# Altium schematic symbol library FPGA_Xilinx_Virtex7.SchLib: 34 symbols (part 13 of 26) (continued)
## XC7VX485T-FFG1927 (continued)
part M pins: A35 MGTREFCLK0P_219, A36 MGTREFCLK0N_219, A39 MGTXRXP3_219, A40 MGTXRXN3_219, B37 MGTXRXP2_219, B38 MGTXRXN2_219, B41 MGTXTXP3_219, B42 MGTXTXN3_219, C35 MGTREFCLK1P_219, C36 MGTREFCLK1N_219, C39 MGTXRXP1_219, C40 MGTXRXN1_219, C43 MGTXTXP2_219, C44 MGTXTXN2_219, D37 MGTXRXP3_218, D38 MGTXRXN3_218, D41 MGTXRXP0_219, D42 MGTXRXN0_219, E35 MGTREFCLK0P_218, E36 MGTREFCLK0N_218, E39 MGTXRXP2_218, E40 MGTXRXN2_218, E43 MGTXTXP1_219, E44 MGTXTXN1_219, F37 MGTXRXP1_218, F38 MGTXRXN1_218, F41 MGTXTXP0_219, F42 MGTXTXN0_219, G35 MGTREFCLK1P_218, G36 MGTREFCLK1N_218, G39 MGTXRXP0_218, G40 MGTXRXN0_218, G43 MGTXTXP3_218, G44 MGTXTXN3_218, H41 MGTXTXP2_218, H42 MGTXTXN2_218, J43 MGTXTXP1_218, J44 MGTXTXN1_218, K41 MGTXTXP0_218, K42 MGTXTXN0_218
part N pins: AA8 MGTAVCC_G10, AA37 MGTAVCC_G20, AB5 MGTAVTT_G10, AB40 MGTAVTT_G20, AC3 MGTAVTT_G10, AC7 MGTAVCC_G10, AC9 MGTRREF_115, AC10 MGTAVTTRCAL_115, AC35 MGTRREF_215, AC36 MGTAVTTRCAL_215, AC38 MGTAVCC_G20, AC42 MGTAVTT_G20, AD5 MGTAVTT_G10, AD40 MGTAVTT_G20, AE8 MGTAVCC_G10, AE37 MGTAVCC_G20, AF5 MGTAVTT_G10, AF40 MGTAVTT_G20, AG3 MGTAVTT_G10, AG8 MGTAVCC_G10, AG37 MGTAVCC_G20, AG42 MGTAVTT_G20, AH5 MGTAVTT_G10, AH40 MGTAVTT_G20, AJ3 MGTAVTT_G10, AJ7 MGTAVCC_G10, AJ38 MGTAVCC_G20, AJ42 MGTAVTT_G20, AL3 MGTAVTT_G9, AL8 MGTAVCC_G9, AL37 MGTAVCC_G19, AL42 MGTAVTT_G19, AM5 MGTAVTT_G9, AM10 MGTVCCAUX_G9, AM35 MGTVCCAUX_G19, AM40 MGTAVTT_G19, AN8 MGTAVCC_G9, AN37 MGTAVCC_G19, AP5 MGTAVTT_G9, AP10 MGTAVCC_G9, AP35 MGTAVCC_G19, AP40 MGTAVTT_G19, AR3 MGTAVTT_G9, AR8 MGTAVCC_G9, AR37 MGTAVCC_G19, AR42 MGTAVTT_G19, AT5 MGTAVTT_G9, AT40 MGTAVTT_G19, AU8 MGTAVCC_G9, AU37 MGTAVCC_G19, AV5 MGTAVTT_G9, AV40 MGTAVTT_G19, AW3 MGTAVTT_G9, AW8 MGTAVCC_G9, AW37 MGTAVCC_G19, AW42 MGTAVTT_G19, AY5 MGTAVTT_G9, AY40 MGTAVTT_G19, B5 MGTAVTT_G11, B10 MGTAVCC_G11, B35 MGTAVCC_G21, B40 MGTAVTT_G21, BA8 MGTAVCC_G9, BA37 MGTAVCC_G19, BB5 MGTAVTT_G9, BB40 MGTAVTT_G19, BC3 MGTAVTT_G9, BC8 MGTAVCC_G9, BC37 MGTAVCC_G19, BC42 MGTAVTT_G19, C3 MGTAVTT_G11, C42 MGTAVTT_G21, D5 MGTAVTT_G11, D10 MGTAVCC_G11, D35 MGTAVCC_G21, D40 MGTAVTT_G21, F5 MGTAVTT_G11, F10 MGTAVCC_G11, F35 MGTAVCC_G21, F40 MGTAVTT_G21, G3 MGTAVTT_G11, G42 MGTAVTT_G21, H5 MGTAVTT_G11, H10 MGTAVCC_G11, H35 MGTAVCC_G21, H40 MGTAVTT_G21, K5 MGTAVTT_G11, K10 MGTAVCC_G11, K35 MGTAVCC_G21, K40 MGTAVTT_G21, L3 MGTAVTT_G11, L42 MGTAVTT_G21, M5 MGTAVTT_G11, M10 MGTAVCC_G11, M35 MGTAVCC_G21, M40 MGTAVTT_G21, P5 MGTAVTT_G11, P10 MGTVCCAUX_G11, P35 MGTVCCAUX_G21, P40 MGTAVTT_G21, R3 MGTAVTT_G10, R8 MGTAVCC_G10, R37 MGTAVCC_G20, R42 MGTAVTT_G20, T5 MGTAVTT_G10, T10 MGTVCCAUX_G10, T35 MGTVCCAUX_G20, T40 MGTAVTT_G20, U8 MGTAVCC_G10, U37 MGTAVCC_G20, V5 MGTAVTT_G10, V10 MGTVCCAUX_G10, V35 MGTVCCAUX_G20, V40 MGTAVTT_G20, W3 MGTAVTT_G10, W8 MGTAVCC_G10, W37 MGTAVCC_G20, W42 MGTAVTT_G20, Y5 MGTAVTT_G10, Y10 MGTAVCC_G10, Y35 MGTAVCC_G20, Y40 MGTAVTT_G20
part O pins: AC22 VREFN_0, AC23 VP_0, AD22 VN_0, AD23 VREFP_0, AE10 PROGRAM_B_0, AE11 DONE_0, AE12 VCCO_0, AE22 DXN_0, AE23 DXP_0, AE34 CCLK_0, AF10 M2_0, AF34 TMS_0, AF35 TCK_0, AG10 M1_0, AG11 M0_0, AG12 VCCO_0, AG34 TDO_0, AG35 TDI_0, AK11 CFGBVS_0, AK34 INIT_B_0
part P pins: A3 GND, A4 GND, A7 GND, A8 GND, A11 GND, A12 GND, A22 GND, A32 GND, A34 GND, A37 GND, A38 GND, A41 GND, A42 GND, AA13 VCCINT, AA15 VCCINT, AA17 VCCINT, AA19 VCCAUX_IO_G3, AA21 VCCINT, AA23 VCCINT, AA25 VCCBRAM, AA27 VCCAUX, AA29 VCCINT, AA31 VCCINT, AA33 VCCINT, AB12 VCCINT, AB14 VCCINT, AB16 VCCINT, AB18 VCCAUX, AB20 VCCINT, AB22 GNDADC_0, AB23 VCCADC_0, AB24 VCCBRAM, AB26 VCCAUX_IO_G1, AB28 VCCINT, AB30 VCCINT, AB32 VCCINT, AC13 VCCINT, AC15 VCCINT, AC17 VCCINT, AC19 VCCAUX_IO_G3, AC21 VCCINT, AC25 VCCBRAM, AC27 VCCAUX, AC29 VCCINT, AC31 VCCINT, AC33 VCCINT, AD12 VCCINT, AD14 VCCINT, AD16 VCCINT, AD18 VCCAUX, AD20 VCCINT, AD24 VCCBRAM, AD26 VCCAUX_IO_G0, AD28 VCCINT, AD30 VCCINT, AD32 VCCINT, AE13 VCCINT, AE15 VCCINT, AE17 VCCINT, AE19 VCCAUX_IO_G2, AE21 VCCINT, AE25 VCCBRAM, AE27 VCCAUX, AE29 VCCINT, AE31 VCCINT, AE33 VCCINT, AE35 VCCBATT_0, AF12 VCCINT, AF14 VCCINT, AF16 VCCINT, AF18 VCCAUX, AF20 VCCINT, AF22 VCCINT, AF24 VCCBRAM, AF26 VCCAUX_IO_G0, AF28 VCCINT, AF30 VCCINT, AF32 VCCINT, AG13 VCCINT, AG15 VCCINT, AG17 VCCINT, AG19 VCCAUX_IO_G2, AG21 VCCINT, AG23 VCCINT, AG25 VCCBRAM, AG27 VCCAUX, AG29 VCCINT, AG31 VCCINT, AG33 VCCINT, AH12 VCCINT, AH14 VCCINT, AH16 VCCINT, AH18 VCCAUX, AH20 VCCINT, AH22 VCCINT, AH24 VCCBRAM, AH26 VCCAUX_IO_G0, AH28 VCCINT, AH30 VCCINT, AH32 VCCINT, AJ15 VCCINT, AJ17 VCCINT, AJ19 VCCAUX_IO_G2, AJ27 VCCAUX, AJ33 VCCINT, B2 GND, B6 GND, B9 GND, B11 GND, B19 GND, B29 GND, B34 GND, B36 GND, B39 GND, B43 GND, C4 GND, C7 GND, C8 GND, C11 GND, C16 GND, C26 GND, C34 GND, C37 GND, C38 GND, C41 GND, D1 GND, D2 GND, D6 GND, D9 GND, D11 GND, D13 GND, D23 GND, D33 GND, D34 GND, D36 GND, D39 GND, D43 GND, D44 GND, E3 GND, E4 GND, E7 GND, E8 GND, E11 GND, E20 GND, E30 GND, E34 GND, E37 GND, E38 GND, E41 GND, E42 GND, F1 GND, F2 GND, F6 GND, F9 GND, F11 GND, F17 GND, F27 GND, F34 GND, F36 GND, F39 GND, F43 GND, F44 GND, G4 GND, G7 GND, G8 GND, G11 GND, G14 GND, G24 GND, G34 GND, G37 GND, G38 GND, G41 GND, H1 GND, H2 GND, H6 GND, H9 GND, H11 GND, H21 GND, H31 GND, H34 GND, H36 GND, H39 GND, H43 GND, H44 GND, J3 GND, J4 GND, J7 GND, J8 GND, J11 GND, J18 GND, J28 GND, J34 GND, V12 VCCINT, V14 VCCINT, V18 VCCAUX, V20 VCCINT, V22 VCCINT, V24 VCCBRAM, V26 VCCAUX_IO_G1, V28 VCCINT, V30 VCCINT, V32 VCCINT, W13 VCCINT, W15 VCCINT, W17 VCCINT, W19 VCCAUX_IO_G3, W21 VCCINT, W23 VCCINT, W25 VCCBRAM, W27 VCCAUX, W29 VCCINT, W31 VCCINT, W33 VCCINT, Y12 VCCINT, Y14 VCCINT, Y16 VCCINT, Y18 VCCAUX, Y20 VCCINT, Y22 VCCINT, Y24 VCCBRAM, Y26 VCCAUX_IO_G1, Y28 VCCINT, Y30 VCCINT, Y32 VCCINT
part Q pins: AA3 GND, AA4 GND, AA7 GND, AA11 GND, AA12 GND, AA14 GND, AA16 GND, AA18 GND, AA20 GND, AA22 GND, AA24 GND, AA26 GND, AA28 GND, AA30 GND, AA32 GND, AA34 GND, AA38 GND, AA41 GND, AA42 GND, AB1 GND, AB2 GND, AB6 GND, AB9 GND, AB10 GND, AB11 GND, AB13 GND, AB15 GND, AB17 GND, AB19 GND, AB21 GND, AB25 GND, AB27 GND, AB29 GND, AB31 GND, AB33 GND, AB34 GND, AB35 GND, AB36 GND, AB39 GND, AB43 GND, AB44 GND, AC4 GND, AC8 GND, AC11 GND, AC12 GND, AC14 GND, AC16 GND, AC18 GND, AC20 GND, AC24 GND, AC26 GND, AC28 GND, AC30 GND, AC32 GND, AC34 GND, AC37 GND, AC41 GND, AD1 GND, AD2 GND, AD6 GND, AD9 GND, AD10 GND, AD11 GND, AD13 GND, AD15 GND, AD17 GND, AD19 GND, AD21 GND, AD25 GND, AD27 GND, AD29 GND, AD31 GND, AD33 GND, AD34 GND, AD35 GND, AD36 GND, AD39 GND, AD43 GND, AD44 GND, AE3 GND, AE4 GND, AE7 GND, AE9 GND, AE14 GND, AE16 GND, AE18 GND, AE20 GND, AE24 GND, AE26 GND, AE28 GND, AE30 GND, AE32 GND, AE36 GND, AE38 GND, AE41 GND, AE42 GND, AF1 GND, AF2 GND, AF6 GND, AF9 GND, AF11 GND, AF13 GND, AF15 GND, AF17 GND, AF19 GND, AF21 GND, AF23 GND, AF25 GND, AF27 GND, AF29 GND, AF31 GND, AF33 GND, AF36 GND, AF39 GND, AF43 GND, AF44 GND, AG4 GND, AG7 GND, AG9 GND, AG14 GND, AG16 GND, AG18 GND, AG20 GND, AG22 GND, AG24 GND, AG26 GND, AG28 GND, AG30 GND, AG32 GND, AG36 GND, AG38 GND, AG41 GND, AH1 GND, AH2 GND, AH6 GND, AH9 GND, AH10 GND, AH11 GND, AH13 GND, AH15 GND, AH17 GND, AH19 GND, AH21 GND, AH23 GND, AH25 GND, AH27 GND, AH29 GND, AH31 GND, AH33 GND, AH34 GND, J37 GND, J38 GND, J41 GND, J42 GND, K1 GND, K2 GND, K6 GND, K9 GND, K11 GND, K15 GND, K25 GND, K34 GND, K36 GND, K39 GND, K43 GND, K44 GND, L4 GND, L7 GND, L8 GND, L11 GND, L12 GND, L22 GND, L32 GND, L34 GND, L37 GND, L38 GND, L41 GND, M1 GND, M2 GND, M6 GND, M9 GND, M11 GND, M19 GND, M29 GND, M34 GND, M36 GND, M39 GND, M43 GND, M44 GND, N3 GND, N4 GND, N7 GND, N8 GND, N11 GND, N16 GND, N26 GND, N34 GND, N37 GND, N38 GND, N41 GND, N42 GND, P1 GND, P2 GND, P6 GND, P9 GND, P11 GND, P13 GND, P23 GND, P33 GND, P34 GND, P36 GND, P39 GND, P43 GND, P44 GND, R4 GND, R7 GND, R11 GND, R20 GND, R30 GND, R34 GND, R38 GND, R41 GND, T1 GND, T2 GND, T6 GND, T9 GND, T11 GND, T17 GND, T27 GND, T34 GND, T36 GND, T39 GND, T43 GND, T44 GND, U3 GND, U4 GND, U7 GND, U11 GND, U14 GND, U24 GND, U34 GND, U38 GND, U41 GND, U42 GND, V1 GND, V2 GND, V6 GND, V9 GND, V11 GND, V13 GND, V17 GND, V19 GND, V21 GND, V23 GND, V25 GND, V27 GND, V29 GND, V31 GND, V33 GND, V34 GND, V36 GND, V39 GND, V43 GND, V44 GND, W4 GND, W7 GND, W11 GND, W12 GND, W14 GND, W16 GND, W18 GND, W20 GND, W22 GND, W24 GND, W26 GND, W28 GND, W30 GND, W32 GND, W34 GND, W38 GND, W41 GND, Y1 GND, Y2 GND, Y6 GND, Y9 GND, Y11 GND, Y13 GND, Y15 GND, Y17 GND, Y19 GND, Y21 GND, Y23 GND, Y25 GND, Y27 GND, Y29 GND, Y31 GND, Y33 GND, Y34 GND, Y36 GND, Y39 GND, Y43 GND, Y44 GND
part R pins: AH35 GND, AH36 GND, AH39 GND, AH43 GND, AH44 GND, AJ4 GND, AJ8 GND, AJ11 GND, AJ12 GND, AJ18 GND, AJ20 GND, AJ24 GND, AJ28 GND, AJ34 GND, AJ37 GND, AJ41 GND, AK1 GND, AK2 GND, AK5 GND, AK6 GND, AK9 GND, AK10 GND, AK15 GND, AK25 GND, AK35 GND, AK36 GND, AK39 GND, AK40 GND, AK43 GND, AK44 GND, AL4 GND, AL7 GND, AL11 GND, AL12 GND, AL22 GND, AL32 GND, AL34 GND, AL38 GND, AL41 GND, AM1 GND, AM2 GND, AM6 GND, AM9 GND, AM11 GND, AM19 GND, AM29 GND, AM34 GND, AM36 GND, AM39 GND, AM43 GND, AM44 GND, AN3 GND, AN4 GND, AN7 GND, AN11 GND, AN16 GND, AN26 GND, AN34 GND, AN38 GND, AN41 GND, AN42 GND, AP1 GND, AP2 GND, AP6 GND, AP9 GND, AP11 GND, AP13 GND, AP23 GND, AP33 GND, AP34 GND, AP36 GND, AP39 GND, AP43 GND, AP44 GND, AR4 GND, AR7 GND, AR11 GND, AR20 GND, AR30 GND, AR34 GND, AR38 GND, AR41 GND, AT1 GND, AT2 GND, AT6 GND, AT9 GND, AT10 GND, AT11 GND, AT17 GND, AT27 GND, AT34 GND, AT35 GND, AT36 GND, AT39 GND, AT43 GND, AT44 GND, AU3 GND, AU4 GND, AU7 GND, AU9 GND, AU14 GND, AU24 GND, AU34 GND, AU36 GND, AU38 GND, AU41 GND, AU42 GND, AV1 GND, AV2 GND, AV6 GND, AV9 GND, AV11 GND, AV21 GND, AV31 GND, AV36 GND, AV39 GND, AV43 GND, AV44 GND, AW4 GND, AW7 GND, AW9 GND, AW18 GND, AW28 GND, AW36 GND, AW38 GND, AW41 GND, AY1 GND, AY2 GND, AY6 GND, AY9 GND, AY15 GND, AY25 GND, AY35 GND, AY36 GND, AY39 GND, AY43 GND, AY44 GND, BA3 GND, BA4 GND, BA7 GND, BA9 GND, BA12 GND, BA22 GND, BA32 GND, BA36 GND, BA38 GND, BA41 GND, BA42 GND, BB1 GND, BB2 GND, BB6 GND, BB9 GND, BB19 GND, BB29 GND, BB36 GND, BB39 GND, BB43 GND, BB44 GND, BC2 GND, BC4 GND, BC7 GND, BC9 GND, BC16 GND, BC26 GND, BC36 GND, BC38 GND, BC41 GND, BC43 GND, BD5 GND, BD6 GND, BD9 GND, BD13 GND, BD23 GND, BD33 GND, BD36 GND, BD39 GND, BD40 GND

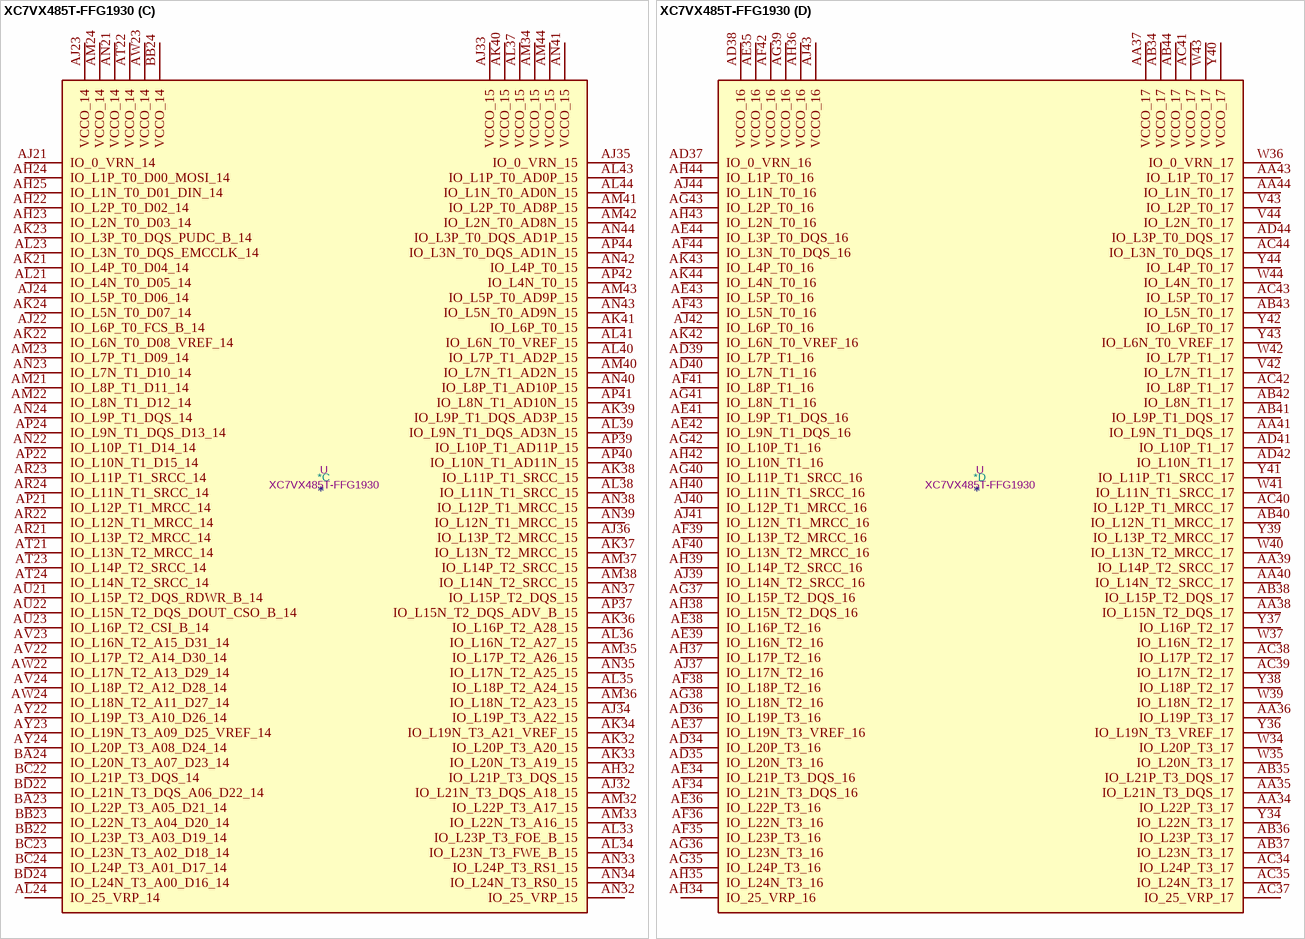
[diagram p92: symbol XC7VX485T-FFG1930]

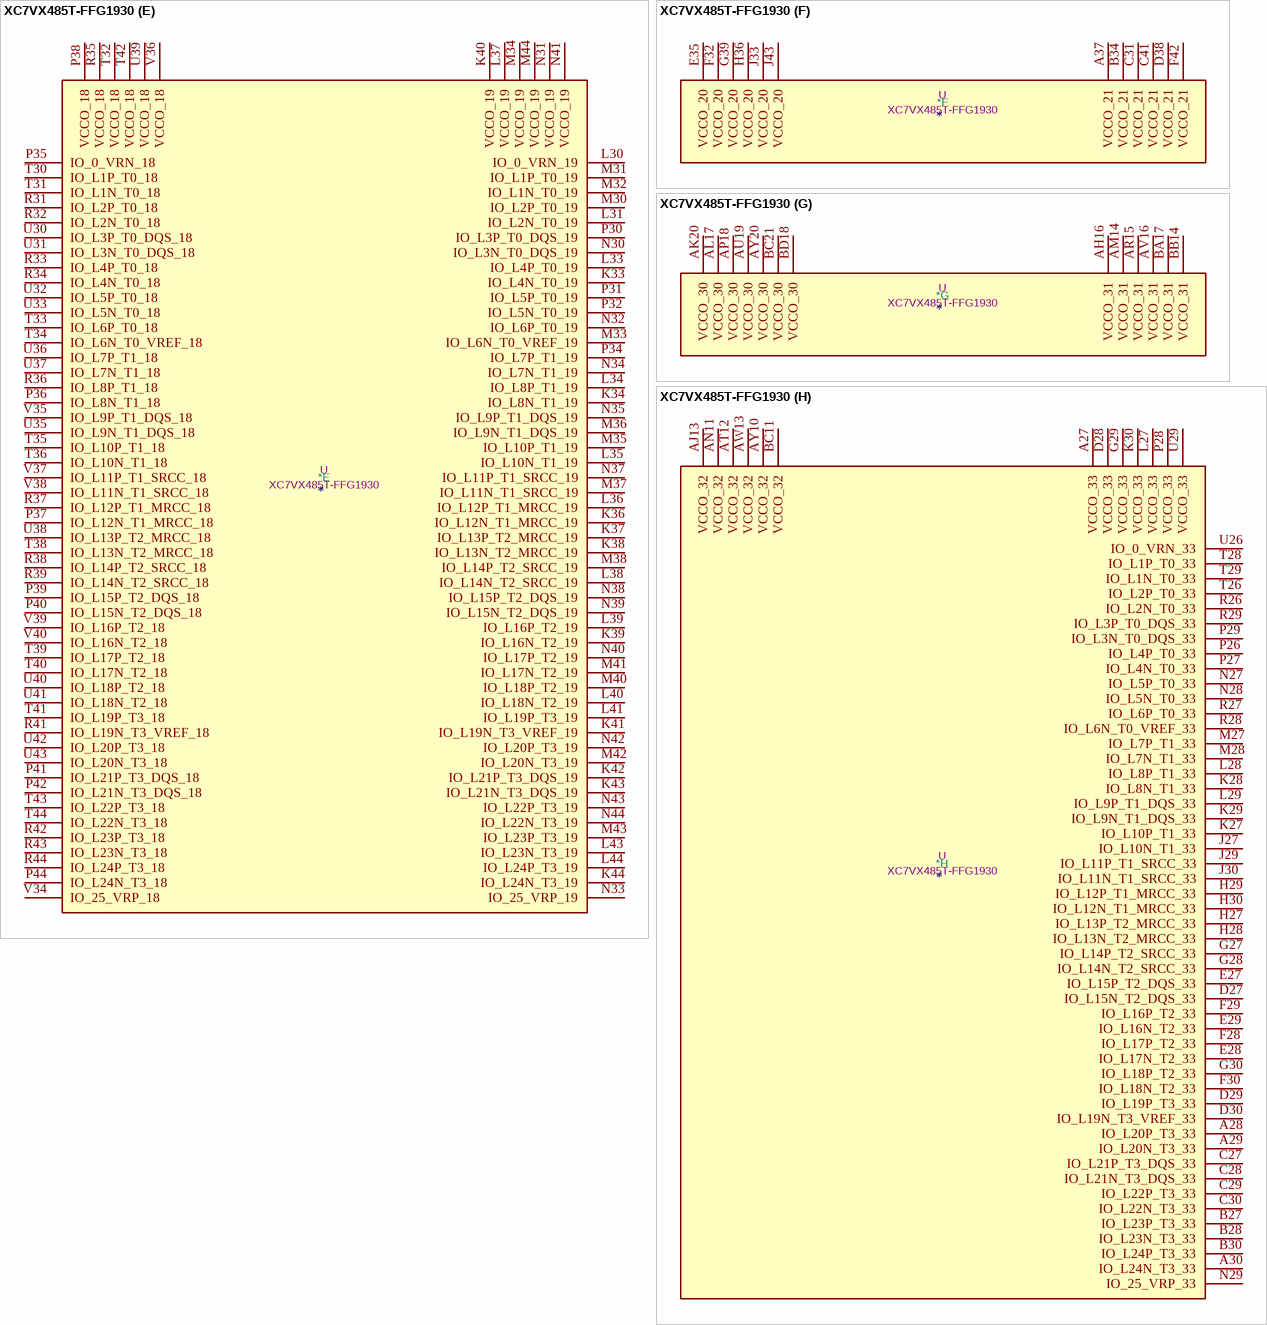
[diagram p93: symbol XC7VX485T-FFG1930]

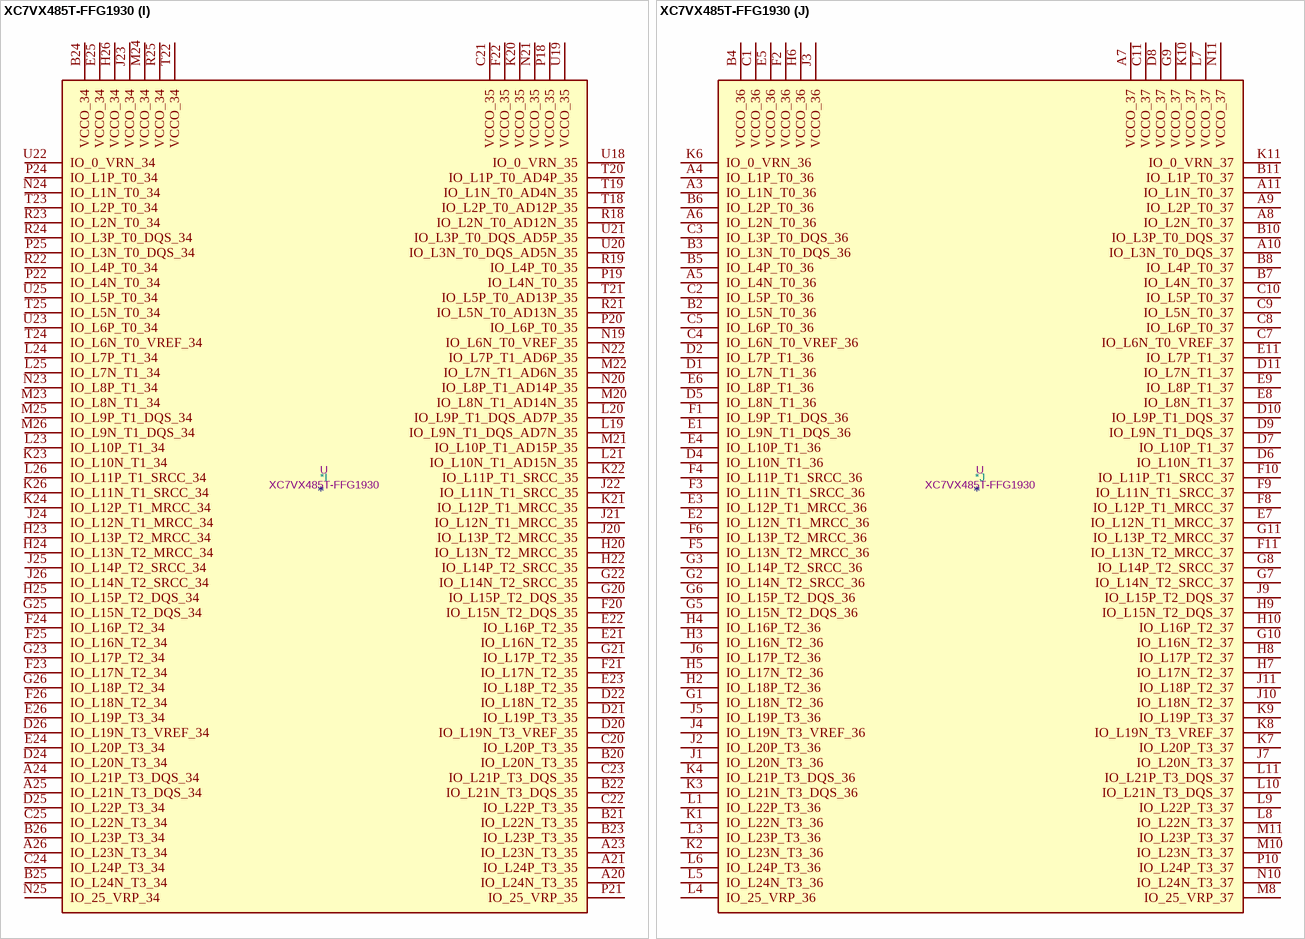
[diagram p94: symbol XC7VX485T-FFG1930]

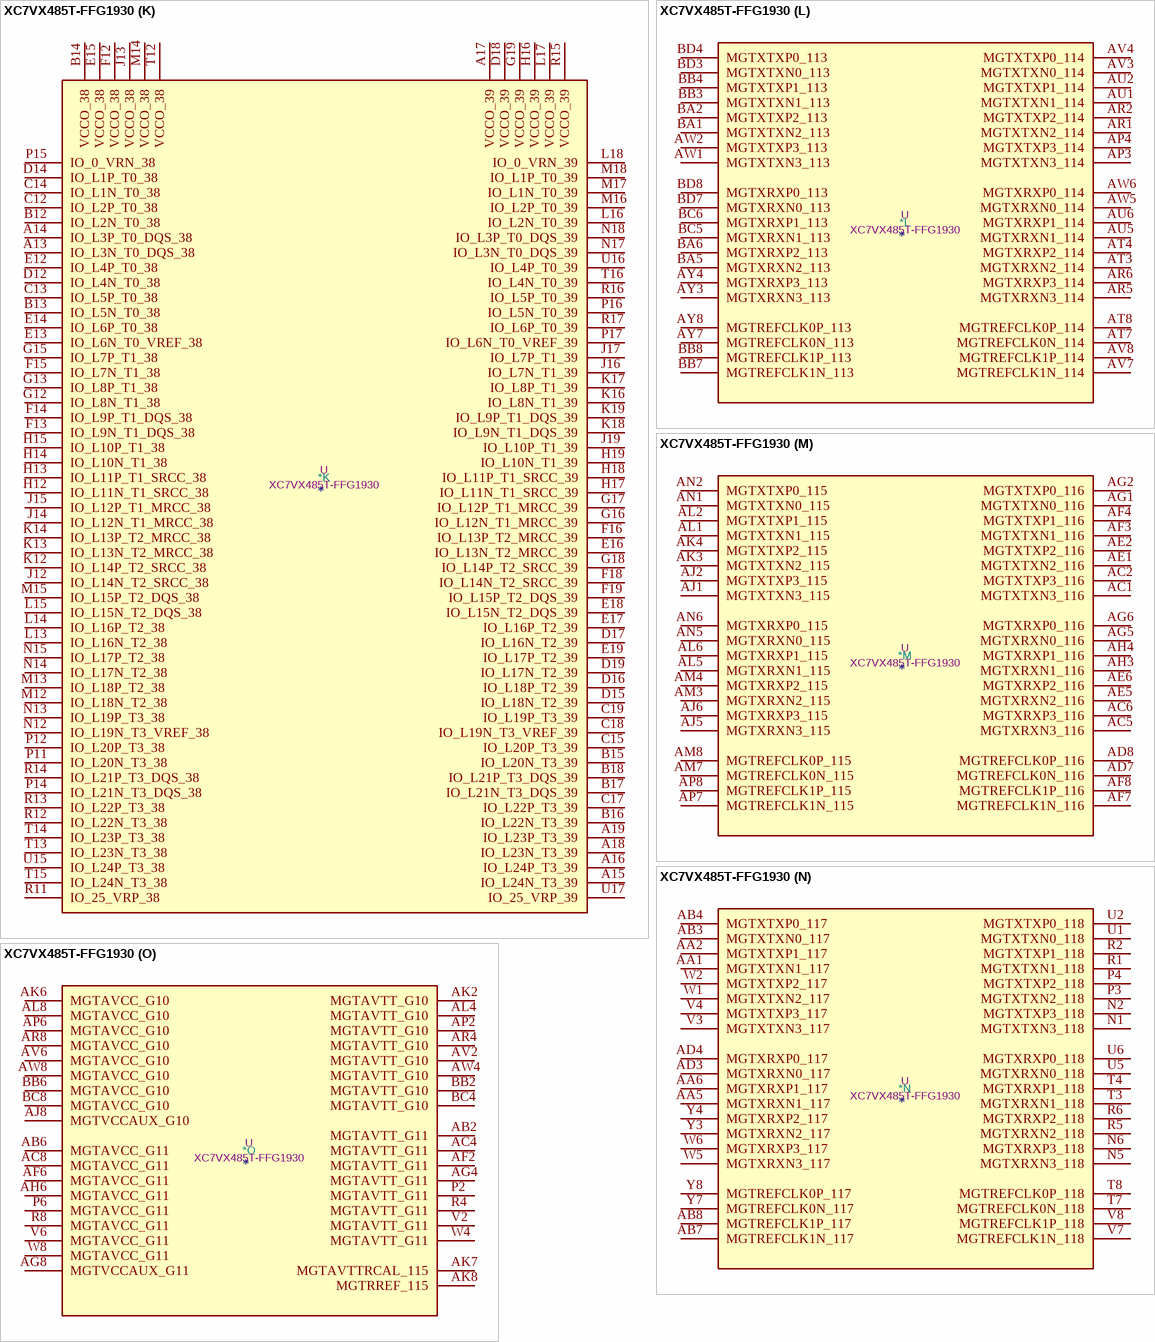
[diagram p95: symbol XC7VX485T-FFG1930]

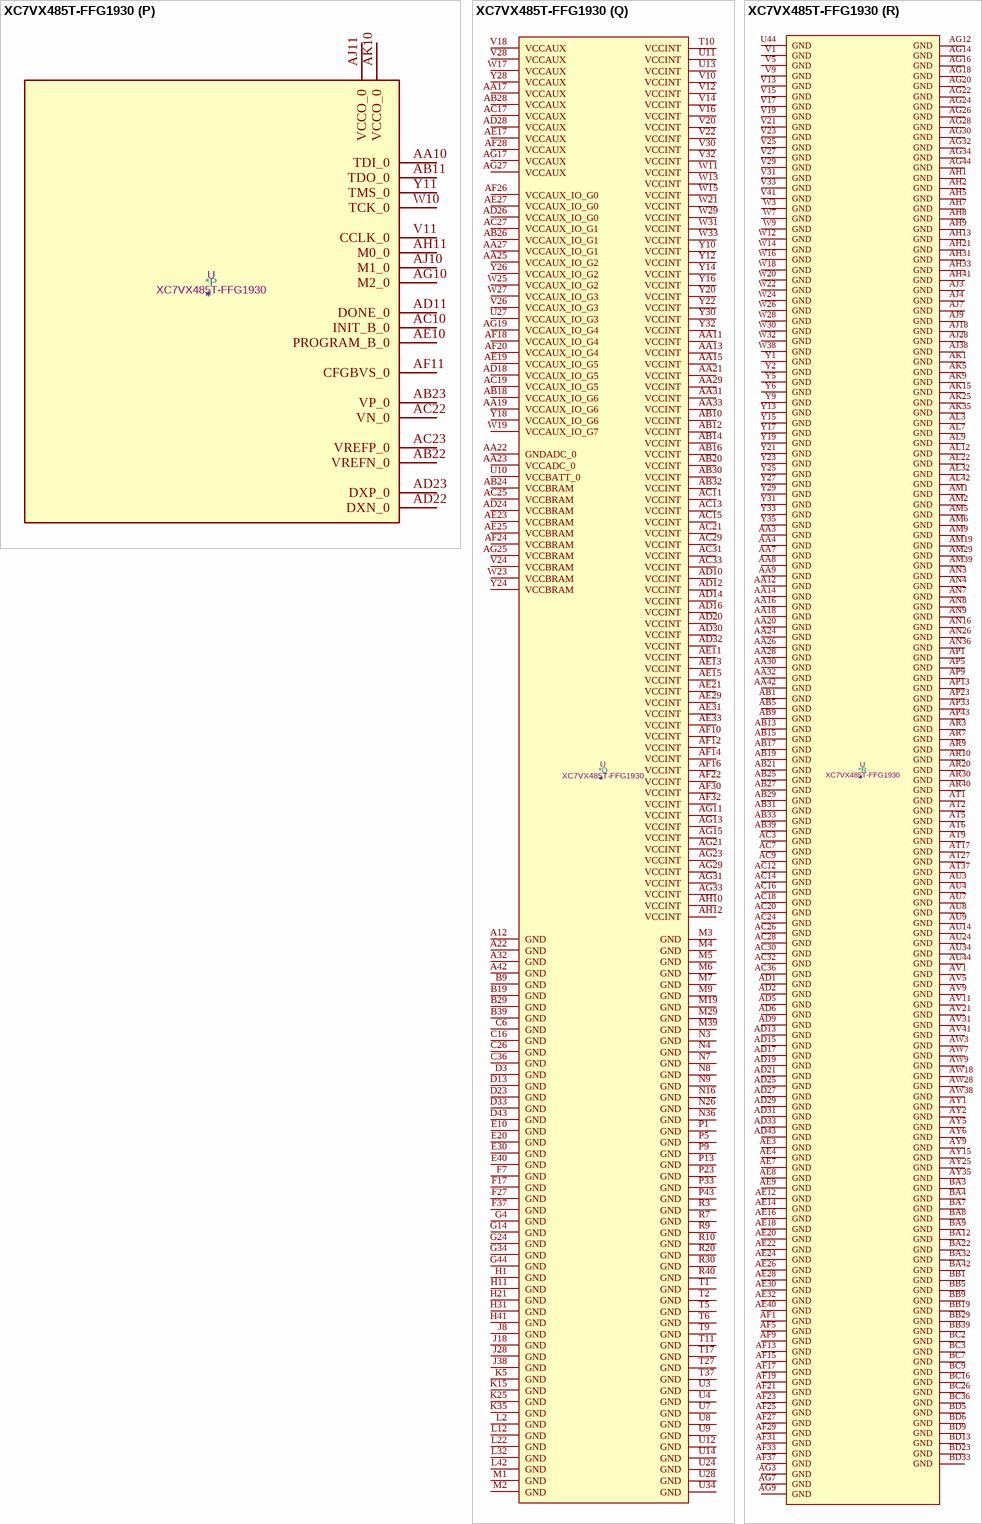
[diagram p96: symbol XC7VX485T-FFG1930]